# Altium footprint library Разъемы.PcbLib: 291 footprints (part 5 of 19)
Each footprint in its own frame and in the unit in brackets; x right, y up, seen from the top. Pads: shape width x height; smd on the part's side, far side on the other; paste and mask are expansions set on the pad; w line width, h text height; cw(c..) or ccw(c..) is an arc to the next point about the centre after c.
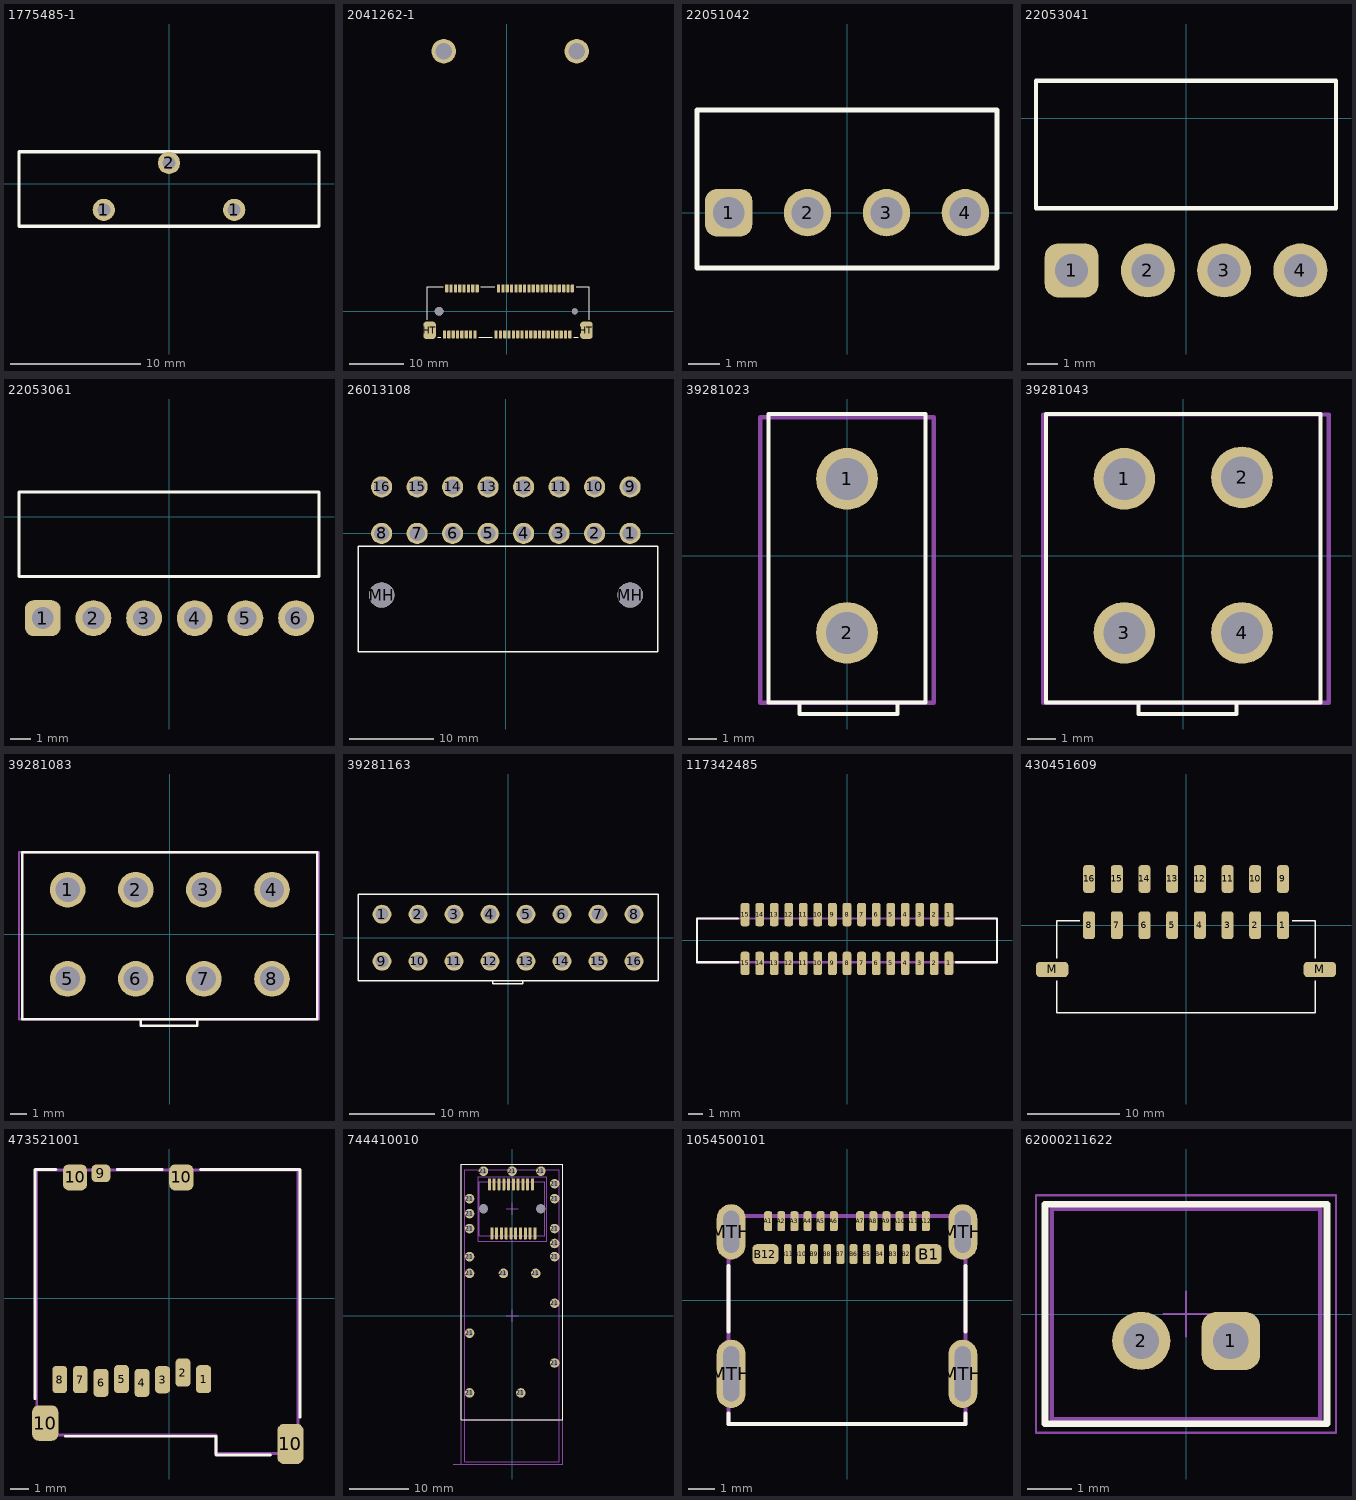
[diagram p4: the footprints below, top view; thin cyan lines are the x and y axes]

## 1775485-1 [mm]
height 18.5
pads (3):
  round 1.7 hole 1: 1(-5,-2) 1(5,-2) 2(0,1.6)
Top Overlay:
  lines w0.254: -11.5,-3.25 -11.5,0 -11.5,2.45 0.55,2.45 11.5,2.45 11.5,0 11.5,-3.25 -0.25,-3.25 -11.5,-3.25
3D body "User Library-TE_2-1775485-1_CR2032_bat_vert_holder.step": height 18.5, standoff -4, extent -11.5,-3.35 11.5,2.45

## 2041262-1 [mm] "Molex, LLC 0533980671, CONN HEADER 6POS 1.25MM VERT SMD"
height 4.8
pads (58):
  rrect50% 0.6x1.5 smd: 1(-11.087,4.226) 2(-10.287,4.226) 3(-9.487,4.226) 4(-8.687,4.226) 5(-7.887,4.226) 6(-7.087,4.226) 7(-6.287,4.226) 8(-5.487,4.226) 9(-1.54,4.233) 10(-0.74,4.233) 11(0.06,4.233) 12(0.86,4.233) 13(1.66,4.233) 14(2.46,4.233) 15(3.26,4.233) 16(4.06,4.233) 17(4.86,4.233) 18(5.66,4.233) 19(6.46,4.233) 20(7.26,4.233) 21(8.06,4.233) 22(8.86,4.233) 23(9.66,4.233) 24(10.46,4.233) 25(11.26,4.233) 26(12.062,4.233) 27(-11.5,-4.25) 28(-10.7,-4.25) 29(-9.9,-4.25) 30(-9.1,-4.25) 31(-8.3,-4.25) 32(-7.5,-4.25) 33(-6.7,-4.25) 34(-5.9,-4.25) 35(-2,-4.25) 36(-1.2,-4.25) 37(-0.4,-4.25) 38(0.4,-4.25) 39(1.2,-4.25) 40(2,-4.25) 41(2.8,-4.25) 42(3.6,-4.25) 43(4.4,-4.25) 44(5.2,-4.25) 45(6,-4.25) 46(6.8,-4.25) 47(7.6,-4.25) 48(8.4,-4.25) 49(9.2,-4.25) 50(10,-4.25) 51(10.8,-4.25) 52(11.604,-4.25)
  rrect50% 2.3x3.2 smd: HT(-14.25,-3.5) HT(14.653,-3.485)
  round 1.6 hole 1.6 unplated: MH(-12.5,0)
  round 1.1 hole 1.1 unplated: MH(12.5,0)
  round 4.5 hole 3: ""(-11.64,47.933) ""(12.86,47.933)
Top Overlay:
  lines w0.15: -14.7,-1.523 -14.7,4.4 -14.7,4.5 -11.763,4.5 ; -12.764,-4.8 -12.177,-4.8 ; -5.223,-4.8 -2.677,-4.8 ; -4.81,4.5 -2.216,4.5 ; 12.28,-4.8 13,-4.8 13.171,-4.8 ; 12.739,4.5 15.2,4.5 15.2,-1.509
  text "." at -11.75,5.5 h0.1
3D body "c-2041262-1-d-3d.stp": height 6.95, standoff -0.5, extent -14.7,-4.75 15.2,4.5

## 22051042 [mm]
height 6.3
pads (4):
  rrect50% 1.5x1.5 hole 1: 1(-3.75,0)
  round 1.5 hole 1: 2(-1.25,0) 3(1.25,0) 4(3.75,0)
Top Overlay:
  lines w0.15: -4.75,-1.75 -4.75,0 -4.75,3.25 4.5,3.25 4.75,3.25 4.75,-1.75 -4.75,-1.75
  text "." at -3.75,4 h0.1
3D body "022051042.stp": height 6.47, standoff -3.25, extent -4.75,-10.1 4.75,3.2

## 22053041 [mm] "KK 254 Solid Header, Right-Angle"
pads (4):
  rrect50% 1.8x1.8 hole 1.1: 1(-3.81,-5.08)
  round 1.8 hole 1.1: 2(-1.27,-5.08) 3(1.27,-5.08) 4(3.81,-5.08)
Top Overlay:
  lines w0.15: -5,-3 0,-3 5,-3 5,1.25 -5,1.25 -5,-3
  text "." at -3.75,-7 h0.1
3D body "022053041.stp": height 6.48, standoff -3.46, extent -5.004,-5.386 5.004,7.543

## 22053061 [mm] "KK 254 Solid Header, Right-Angle"
pads (6):
  rrect50% 1.8x1.8 hole 1.1: 1(-6.35,-5.08)
  round 1.8 hole 1.1: 2(-3.81,-5.08) 3(-1.27,-5.08) 4(1.27,-5.08) 5(3.81,-5.08) 6(6.35,-5.08)
Top Overlay:
  lines w0.15: -7.54,-3 -2.54,-3 7.5,-3 7.5,1.25 -7.54,1.25 -7.54,-3
  text "." at -6.5,-6.75 h0.1
3D body "022053061.stp": height 6.48, standoff -3.46, extent -7.544,-5.386 7.544,7.543

## 26013108 [mm]
pads (18):
  round 2.5 hole 1.8: 1(14.7,0) 2(10.5,0) 3(6.3,0) 4(2.1,0) 5(-2.1,0) 6(-6.3,0) 7(-10.5,0) 8(-14.7,0) 9(14.7,5.5) 10(10.5,5.5) 11(6.3,5.5) 12(2.1,5.5) 13(-2.1,5.5) 14(-6.3,5.5) 15(-10.5,5.5) 16(-14.7,5.5)
  round 3 hole 3 unplated: MH(-14.7,-7.3) MH(14.7,-7.3)
Top Overlay:
  lines w0.15: -17.5,-14 -1.5,-14 18,-14 18,-1.5 -1,-1.5 -17.5,-1.5 -17.5,-14
  text "." at 17,0 h0.1
3D body "026013108.stp": height 11.4, standoff -3.6, extent -17.4,-14 17.797,5.935

## 39281023 [mm] "Mini-Fit Jr.пїЅ Header, Dual Row, Right Angle, with Snap-in Plastic Peg PCB Lock, 4 Circuits, PA Polyamide Nylon 6/6 94V-2, Tin (Sn) Plating"
height 9.6
pads (2):
  round 2.2 hole 1.5: 1(0,2.75) 2(0,-2.75)
Top Overlay:
  lines w0.15: -1.7,-5.25 -1.7,-5.65 1.8,-5.65 1.8,-5.25 ; -2.8,-5.237 2.8,-5.237 2.8,5.063 -2.8,5.063 -2.8,-5.237
  text "." at 0,5.5 h0.1
Top Courtyard:
  lines w0.15: -3.1,-5.25 3.1,-5.25 3.1,4.95 -3.1,4.95 -3.1,-5.25
3D body "39281023.stp": height 12.8, standoff -3.5, extent -3.1,-6.05 3.1,4.95

## 39281043 [mm] "Mini-Fit Jr.пїЅ Header, Dual Row, Right Angle, with Snap-in Plastic Peg PCB Lock, 4 Circuits, PA Polyamide Nylon 6/6 94V-2, Tin (Sn) Plating"
height 9.6
pads (4):
  round 2.2 hole 1.5: 1(-2.1,2.75) 2(2.1,2.8) 3(-2.1,-2.75) 4(2.1,-2.75)
Top Overlay:
  lines w0.15: -1.6,-5.25 -1.6,-5.65 1.9,-5.65 1.9,-5.25 ; -0.7,-5.237 4.9,-5.237 4.9,5.063 -0.7,5.063 ; 0.7,-5.237 -4.9,-5.237 -4.9,5.063 0.7,5.063
  text "." at -3,5.5 h0.1
Top Courtyard:
  lines w0.15: -5,-5.25 -5,5.05 5.2,5.05 5.2,-5.25 0.1,-5.25 -5,-5.25
3D body "39281043.stp": height 12.8, standoff -3.5, extent -5.1,-5.85 5.3,5.15

## 39281083 [mm] "Mini-Fit Jr.пїЅ Header, Dual Row, Right Angle, with Snap-in Plastic Peg PCB Lock, 4 Circuits, PA Polyamide Nylon 6/6 94V-2, Tin (Sn) Plating"
height 9.6
pads (8):
  round 2.2 hole 1.5: 1(-6.3,2.75) 2(-2.1,2.75) 3(2.1,2.75) 4(6.3,2.75) 5(-6.3,-2.75) 6(-2.1,-2.75) 7(2.1,-2.75) 8(6.3,-2.75)
Top Overlay:
  lines w0.15: -1.8,-5.25 -1.8,-5.65 1.7,-5.65 1.7,-5.25 ; -9.1,-5.237 -9.1,5.063 -3.5,5.063 9.1,5.063 9.1,-5.237 3.5,-5.237 -9.1,-5.237
  text "." at -7.25,5.75 h0.1
Top Courtyard:
  lines w0.15: -9.3,-5.25 -9.3,5.05 9.2,5.05 9.2,-5.25 -4.1,-5.25 -9.3,-5.25
3D body "39281083.stp": height 12.8, standoff -3.5, extent -9.4,-5.95 9.4,5.05

## 39281163 [mm] "Mini-Fit Jr.пїЅ Header, Dual Row, Right Angle, with Snap-in Plastic Peg PCB Lock, 16 Circuits, PA Polyamide Nylon 6/6 94V-2, Tin (Sn) Plating"
height 9.6
pads (16):
  round 2.2 hole 1.5: 1(-14.7,2.75) 2(-10.5,2.75) 3(-6.3,2.75) 4(-2.1,2.75) 5(2.1,2.75) 6(6.3,2.75) 7(10.5,2.75) 8(14.7,2.75) 9(-14.7,-2.75) 10(-10.5,-2.75) 11(-6.3,-2.75) 12(-2.1,-2.75) 13(2.1,-2.75) 14(6.3,-2.75) 15(10.5,-2.75) 16(14.7,-2.75)
Top Overlay:
  lines w0.15: -17.5,5.063 -17.5,-5.022 3.259,-4.996 17.5,-4.996 17.5,5.063 -3.5,5.063 -17.5,5.1 ; -1.764,-5 -1.764,-5.4 1.736,-5.4 1.736,-5
  text "." at -15.25,5.75 h0.1
3D body "039281163.stp": height 12.8, standoff -3.5, extent -17.8,-6 17.8,5

## 117342485 [mm]
pads (30):
  rrect50% 0.6x1.6 smd mask+0.05: 1(7,-1.575) 1(7,1.775) 2(6,-1.575) 2(6,1.775) 3(5,-1.575) 3(5,1.775) 4(4,-1.575) 4(4,1.775) 5(3,-1.575) 5(3,1.775) 6(2,-1.575) 6(2,1.775) 7(1,-1.575) 7(1,1.775) 8(0,-1.575) 8(0,1.775) 9(-1,-1.575) 9(-1,1.775) 10(-2,-1.575) 10(-2,1.775) 11(-3,-1.575) 11(-3,1.775) 12(-4,-1.575) 12(-4,1.775) 13(-5,-1.575) 13(-5,1.775) 14(-6,-1.575) 14(-6,1.775) 15(-7,-1.575) 15(-7,1.775)
Top Overlay:
  lines w0.15: -7.5,-1.5 -10.3,-1.5 -10.3,0 -10.3,1.5 -7.5,1.5 ; 7.5,-1.5 10.3,-1.5 10.3,0 10.3,1.5 7.5,1.5
  text "." at 7.9,2 h0.1
Top Courtyard:
  lines w0.15: -10.3,-1.5 10.3,-1.5 10.3,1.5 -10.3,1.5 -10.3,-1.5
3D body "1-1734248-5--3DModel-STEP-56544.STEP": height 7.7, standoff 0, extent -11.2,-2.425 11.2,2.425

## 430451609 [mm]
pads (18):
  rrect50% 1.3x3 smd: 1(10.5,0) 2(7.5,0) 3(4.5,0) 4(1.5,0) 5(-1.5,0) 6(-4.5,0) 7(-7.5,0) 8(-10.5,0) 9(10.5,5) 10(7.5,5) 11(4.5,5) 12(1.5,5) 13(-1.5,5) 14(-4.5,5) 15(-7.5,5) 16(-10.5,5)
  rrect50% 3.5x1.65 smd: M(-14.5,-4.8) M(14.5,-4.8)
Top Overlay:
  lines w0.15: -14,-6.002 -14,-9.5 0,-9.5 14,-9.5 14,-6.002 ; -14,-3.598 -14,0.5 -11.527,0.5 ; 11.527,0.5 14,0.5 14,-3.598
  text "." at 12.5,1 h0.1
3D body "430451609.stp": height 8.83, standoff 0.06, extent -15.825,-9.455 15.825,5.943

## 473521001 [mm]
pads (13):
  rrect50% 0.8x1.5 smd: 1(1.831,-4.34) 2(0.727,-3.985) 4(-1.473,-4.538) 5(-2.567,-4.333) 6(-3.665,-4.534)
  rrect50% 0.8x1.45 smd: 3(-0.368,-4.367) 7(-4.779,-4.36) 8(-5.876,-4.356)
  rrect50% 1x0.95 smd: 9(-3.667,6.693)
  rrect50% 1.4x1.9 smd: 10(-6.656,-6.688)
  rrect50% 1.3x1.4 smd: 10(-5.059,6.475) 10(0.64,6.471)
  rrect50% 1.4x2.15 smd: 10(6.485,-7.808)
Top Overlay:
  lines w0.15: -7.2,-5.388 -7.2,6.9 -6.084,6.9 ; -5.588,-7.4 2.5,-7.4 2.5,-8.4 5.409,-8.4 ; -2.791,6.9 -0.384,6.9 ; 1.665,6.9 7,6.9 7,-6.376
Top Courtyard:
  lines w0.15: -7.11,-7.326 -7.11,6.875 6.892,6.875 6.892,-8.325 2.5,-8.325 2.5,-7.326 -7.11,-7.326
Top Designator:
  text ".Designator" at -4.084,-1.121 h0.8
3D body "473521001.stp": height 1.95, standoff 0.07, extent -7.157,-8.273 6.943,6.927

## 744410010 [mm] "SFP connector"
pads (42):
  rrect50% 0.5x2 smd: 1(-3.4,13.8) 2(-2.6,13.8) 3(-1.8,13.8) 4(-1,13.8) 5(-0.2,13.8) 6(0.6,13.8) 7(1.4,13.8) 8(2.2,13.8) 9(3,13.8) 10(3.8,13.8) 11(3.4,22) 12(2.6,22) 13(1.8,22) 14(1,22) 15(0.2,22) 16(-0.6,22) 17(-1.4,22) 18(-2.2,22) 19(-3,22) 20(-3.8,22)
  round 1.6 hole 0.95: 21(-7.13,-12.9) 21(-7.13,-2.9) 21(-7.13,7.1) 21(-7.13,9.9) 21(-7.13,14.6) 21(-7.13,17.1) 21(-7.13,19.6) 21(-4.8,24.2) 21(-1.45,7.1) 21(0,24.2) 21(1.45,-12.9) 21(3.95,7.1) 21(4.8,24.2) 21(7.12,-7.9) 21(7.12,2.1) 21(7.12,9.9) 21(7.12,12.1) 21(7.12,14.6) 21(7.12,19.6) 21(7.12,22.1)
  round 0 hole 1.55: ""(-4.8,17.9) ""(4.8,17.9)
Top Overlay:
  lines w0.15: -8.5,-17.4 -8.5,25.4 8.5,25.4 8.5,-17.4 -8.5,-17.4
Top Designator:
  text ".Designator" at -4.676,0.046 h0.8
Mechanical 13:
  lines w0.2: -7.918,-17.4 7.9,-17.4 ; -7.918,-24.4 -7.918,24.4 7.918,24.4 7.918,-24.4 -7.918,-24.4 ; -5.5,13.4 -5.5,22.4 5.5,22.4 5.5,13.4 -5.5,13.4
Mechanical 15:
  lines w0.1: -9.88,-24.8 -8.5,-24.8 ; -1,0 1,0 ; -1,17.9 1,17.9 ; 0,-1 0,1 ; 0,16.9 0,18.9 ; -8.5,-24.8 -8.5,25.4 ; -8.5,-24.8 -7.9,-24.8 7.12,-24.8 8.5,-24.8 8.5,25.4 -8.5,25.4 ; -8.5,-24.8 -8.5,25.4 ; -5.7,12.5 5.8,12.5 5.8,23.3 -5.7,23.3 -5.7,13 -5.7,12.5
3D body "c-1489669-1-c2-3d.stp": height 10.37, standoff -3.01, extent -7.918,-24.4 7.918,24.4
3D body "c-1367073-2-f-3d.stp": height 5.2, standoff -0.8, extent -5.5,13.4 5.5,22.4

## 1054500101 [mm]
height 3.3
pads (28):
  rrect50% 0.3x0.76 smd: A1(-3,3) A2(-2.5,3) A3(-2,3) A4(-1.5,3) A5(-1,3) A6(-0.5,3) A7(0.5,3) A8(1,3) A9(1.5,3) A10(2,3) A11(2.5,3) A12(3,3) B2(2.25,1.75) B3(1.75,1.75) B4(1.25,1.75) B5(0.75,1.75) B6(0.25,1.75) B7(-0.25,1.75) B8(-0.75,1.75) B9(-1.25,1.75) B10(-1.75,1.75) B11(-2.25,1.75)
  rrect50% 1x0.76 smd: B1(3.1,1.75) B12(-3.1,1.75)
  oval 1.1x2.6 hole 0.6 slot 2.1 at 90 deg: MTH(-4.4,-2.8) MTH(4.4,-2.8)
  oval 1.1x2.1 hole 0.6 slot 1.6 at 90 deg: MTH(-4.4,2.6) MTH(4.4,2.6)
Top Overlay:
  lines w0.15: -4.5,-4.3 -4.5,-4.7 0,-4.7 4.5,-4.7 4.5,-4.3 ; -4.5,-1.2 -4.5,1.3 ; 4.5,-1.2 4.5,1.3
Top Courtyard:
  lines w0.15: -4.5,-4.7 -4.5,3.2 4.5,3.2 4.5,-4.7 -4.5,-4.7
Top Designator:
  text ".Designator" at -3.999,-0.778 h0.8
3D body "1054500101.stp": height 3.18, standoff -0.78, extent -4.47,-4.7 4.47,3.2

## 62000211622 [mm] "2.00mm Male Vertical Shrouded Header, 2p"
height 6.1
pads (2):
  rrect50% 1.3x1.3 hole 0.8: 1(1,-0.6)
  round 1.3 hole 0.8: 2(-1,-0.6)
Top Overlay:
  lines w0.15: -3.15,-2.45 3.15,-2.45 3.15,2.45 -3.15,2.45 -3.15,-2.45
  text "." at 1.475,-3.1 h0.1
Top Courtyard:
  lines w0.05: -0.5,0 0.5,0 ; 0,-0.5 0,0.5 ; -3.35,-2.65 3.35,-2.65 3.35,2.65 -3.35,2.65 -3.35,-2.65
Top Designator:
  text ".Designator" at -3.999,-0.729 h0.8
Top Component Outline:
  lines w0.1: -3,-2.35 -3,2.35 3,2.35 3,-2.35 -3,-2.35
3D body "62000211622.stp": height 6.13, standoff -3.36, extent -3,-2.35 3,2.35